# Altium footprint library IC.PcbLib: 386 footprints (part 2 of 30)
Each footprint in its own frame and in the unit in brackets; x right, y up, seen from the top. Pads: shape width x height; smd on the part's side, far side on the other; paste and mask are expansions set on the pad; w line width, h text height; cw(c..) or ccw(c..) is an arc to the next point about the centre after c.
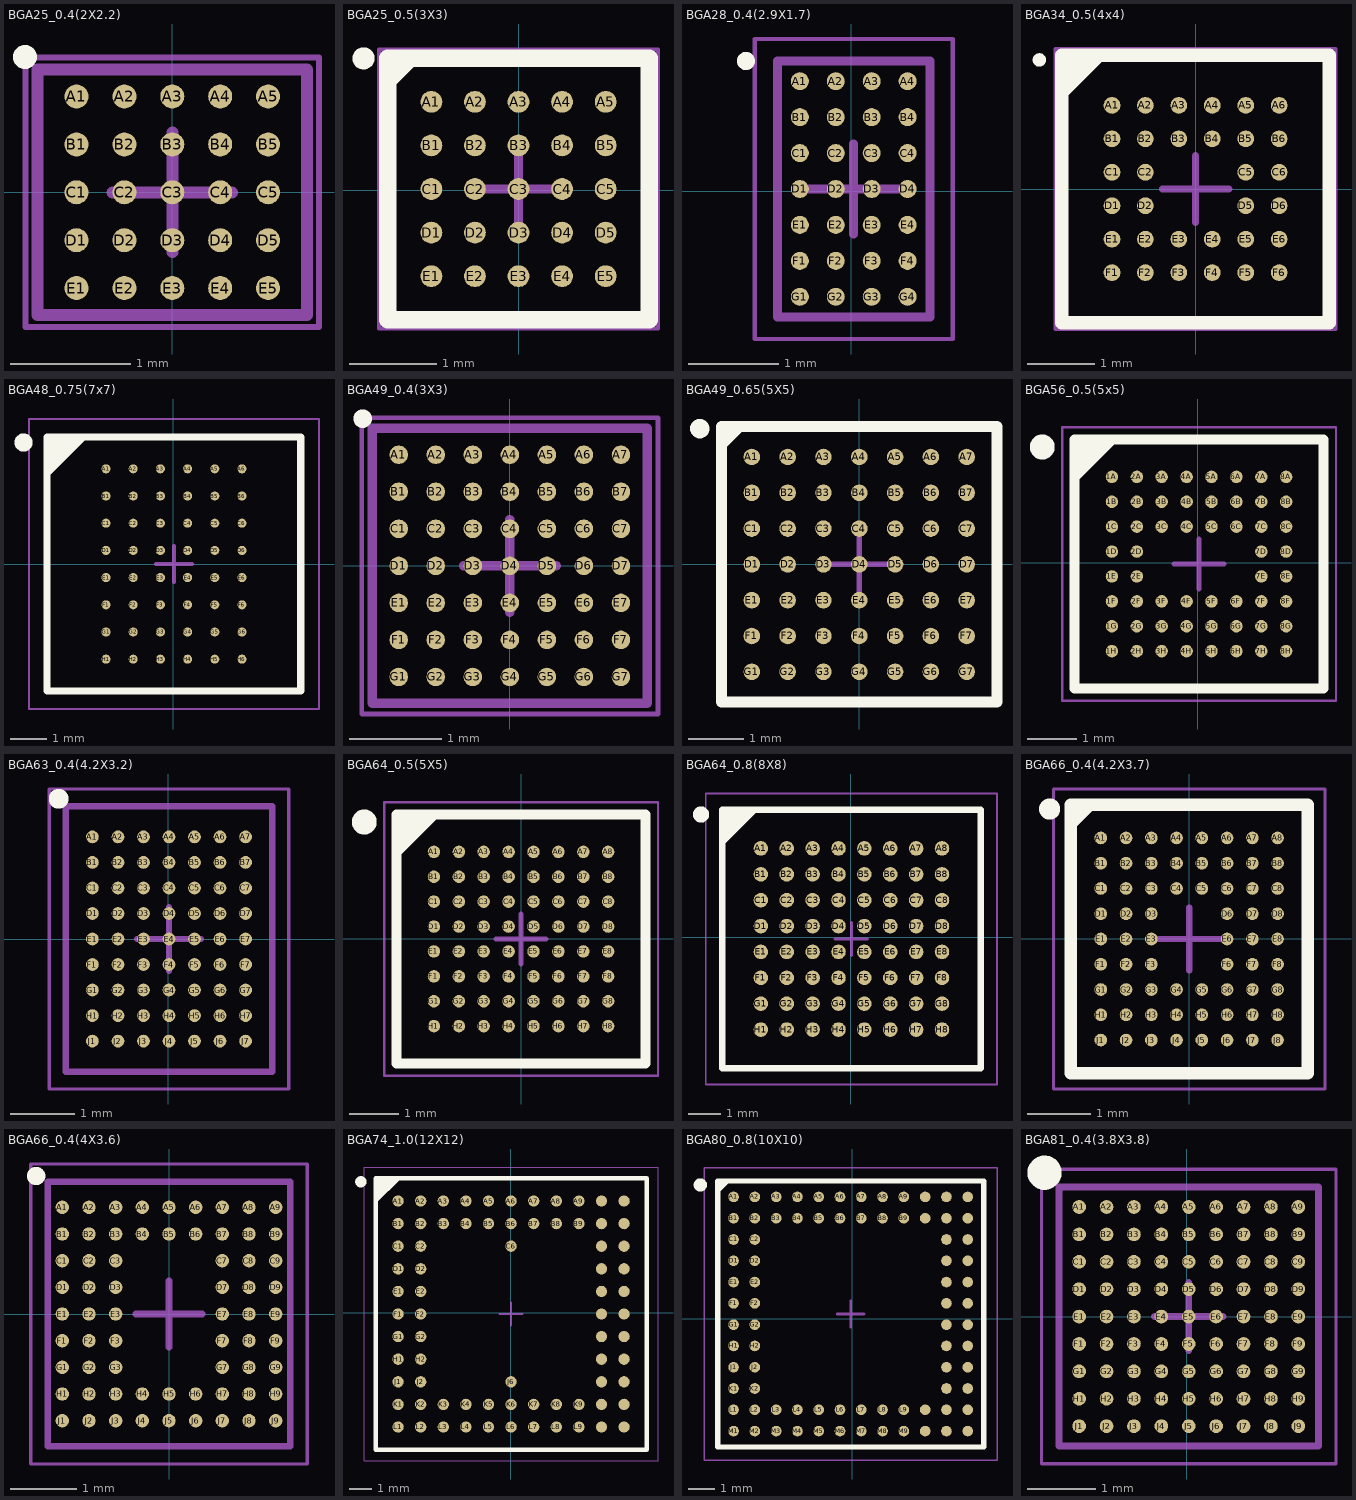
[diagram p1: the footprints below, top view; thin cyan lines are the x and y axes]

## BGA25_0.4(2X2.2) [mm]
pads (25):
  round 0.2 smd: A1(-0.8,0.8) A2(-0.4,0.8) A3(0,0.8) A4(0.4,0.8) A5(0.8,0.8) B1(-0.8,0.4) B2(-0.4,0.4) B3(0,0.4) B4(0.4,0.4) B5(0.8,0.4) C1(-0.8,0) C2(-0.4,0) C3(0,0) C4(0.4,0) C5(0.8,0) D1(-0.8,-0.4) D2(-0.4,-0.4) D3(0,-0.4) D4(0.4,-0.4) D5(0.8,-0.4) E1(-0.8,-0.8) E2(-0.4,-0.8) E3(0,-0.8) E4(0.4,-0.8) E5(0.8,-0.8)
Top Overlay:
  circle w0.1: c-1.23,1.13 r0.05
Mechanical 13:
  lines w0.1: -1.125,-1.025 1.125,-1.025 1.125,1.025 -1.125,1.025 -1.125,-1.025
Mechanical 15:
  lines w0.05: -1.225,-1.125 1.225,-1.125 1.225,1.125 -1.225,1.125 -1.225,-1.125
  lines w0.1: -0.5,0 0.5,0 ; 0,-0.5 0,0.5
3D body "BGA25C40P5X5_220X200X65.step": height 0.65, standoff 0, extent -1.1,-1 1.1,1

## BGA25_0.5(3X3) [mm]
pads (25):
  round 0.25 smd: A1(-1,1.013) A2(-0.5,1.013) A3(0,1.013) A4(0.5,1.013) A5(1,1.013) B1(-1,0.513) B2(-0.5,0.513) B3(0,0.513) B4(0.5,0.513) B5(1,0.513) C1(-1,0.013) C2(-0.5,0.013) C3(0,0.013) C4(0.5,0.013) C5(1,0.013) D1(-1,-0.487) D2(-0.5,-0.487) D3(0,-0.487) D4(0.5,-0.487) D5(1,-0.487) E1(-1,-0.987) E2(-0.5,-0.987) E3(0,-0.987) E4(0.5,-0.987) E5(1,-0.987)
Top Overlay:
  circle w0.127: c-1.778,1.511 r0.064
  region: -1.242,1.513 -1.5,1.255 -1.5,1.513
  lines w0.2: -1.5,1.255 -1.242,1.513 ; -1.5,-1.487 1.5,-1.487 1.5,1.513 -1.5,1.513 -1.5,-1.487
Mechanical 13:
  lines w0.1: -1.5,-1.487 1.5,-1.487 1.5,1.513 -1.5,1.513 -1.5,-1.487
Mechanical 15:
  lines w0.05: -1.6,-1.587 1.6,-1.587 1.6,1.613 -1.6,1.613 -1.6,-1.587
  lines w0.1: -0.5,0.013 0.5,0.013 ; 0,-0.487 0,0.513
3D body "BGA25C50P5X5_300X300X65.step": height 0.65, standoff 0, extent -1.5,-1.5 1.5,1.5

## BGA28_0.4(2.9X1.7) [mm]
pads (28):
  round 0.2 smd: A1(-0.575,1.225) A2(-0.175,1.225) A3(0.225,1.225) A4(0.625,1.225) B1(-0.575,0.825) B2(-0.175,0.825) B3(0.225,0.825) B4(0.625,0.825) C1(-0.575,0.425) C2(-0.175,0.425) C3(0.225,0.425) C4(0.625,0.425) D1(-0.575,0.025) D2(-0.175,0.025) D3(0.225,0.025) D4(0.625,0.025) E1(-0.575,-0.375) E2(-0.175,-0.375) E3(0.225,-0.375) E4(0.625,-0.375) F1(-0.575,-0.775) F2(-0.175,-0.775) F3(0.225,-0.775) F4(0.625,-0.775) G1(-0.575,-1.175) G2(-0.175,-1.175) G3(0.225,-1.175) G4(0.625,-1.175)
Top Overlay:
  circle w0.1: c-1.175,1.45 r0.05
Mechanical 13:
  lines w0.1: -0.825,-1.4 -0.825,1.45 0.875,1.45 0.875,-1.4 -0.825,-1.4
Mechanical 15:
  lines w0.05: -1.075,-1.645 -1.075,1.695 1.125,1.695 1.125,-1.645 -1.075,-1.645
  lines w0.1: -0.475,0.025 0.525,0.025 ; 0.025,-0.475 0.025,0.525
3D body "BGA28C40P4X7_170X290X65.step": height 0.65, standoff 0, extent -0.85,-1.45 0.85,1.45

## BGA34_0.5(4x4) [mm]
pads (32):
  round 0.25 smd: A1(-1.25,1.25) A2(-0.75,1.25) A3(-0.25,1.25) A4(0.25,1.25) A5(0.75,1.25) A6(1.25,1.25) B1(-1.25,0.75) B2(-0.75,0.75) B3(-0.25,0.75) B4(0.25,0.75) B5(0.75,0.75) B6(1.25,0.75) C1(-1.25,0.25) C2(-0.75,0.25) C5(0.75,0.25) C6(1.25,0.25) D1(-1.25,-0.25) D2(-0.75,-0.25) D5(0.75,-0.25) D6(1.25,-0.25) E1(-1.25,-0.75) E2(-0.75,-0.75) E3(-0.25,-0.75) E4(0.25,-0.75) E5(0.75,-0.75) E6(1.25,-0.75) F1(-1.25,-1.25) F2(-0.75,-1.25) F3(-0.25,-1.25) F4(0.25,-1.25) F5(0.75,-1.25) F6(1.25,-1.25)
Top Overlay:
  circle w0.1: c-2.337,1.93 r0.05
  region: -1.4,2 -2,1.4 -2,2
  lines w0.2: -2,1.442 -1.442,2 ; -2,-2 -2,2 2,2 2,-2 -2,-2
Mechanical 13:
  lines w0.1: -2,-2 -2,2 2,2 2,-2 -2,-2
Mechanical 15:
  lines w0.05: -2.1,-2.1 -2.1,2.1 2.1,2.1 2.1,-2.1 -2.1,-2.1
  lines w0.1: -0.5,0 0.5,0 ; 0,-0.5 0,0.5
3D body: height 0.6, standoff 0.2, extent -2,-2 2,2
3D body: height 0.61, standoff 0.18, extent -1.671,1.299 -1.273,1.698

## BGA48_0.75(7x7) [mm]
height 0.254
pads (48):
  round 0.25 smd: A1(-1.85,2.625) A2(-1.1,2.625) A3(-0.35,2.625) A4(0.4,2.625) A5(1.15,2.625) A6(1.9,2.625) B1(-1.85,1.875) B2(-1.1,1.875) B3(-0.35,1.875) B4(0.4,1.875) B5(1.15,1.875) B6(1.9,1.875) C1(-1.85,1.125) C2(-1.1,1.125) C3(-0.35,1.125) C4(0.4,1.125) C5(1.15,1.125) C6(1.9,1.125) D1(-1.85,0.375) D2(-1.1,0.375) D3(-0.35,0.375) D4(0.4,0.375) D5(1.15,0.375) D6(1.9,0.375) E1(-1.85,-0.375) E2(-1.1,-0.375) E3(-0.35,-0.375) E4(0.4,-0.375) E5(1.15,-0.375) E6(1.9,-0.375) F1(-1.85,-1.125) F2(-1.1,-1.125) F3(-0.35,-1.125) F4(0.4,-1.125) F5(1.15,-1.125) F6(1.9,-1.125) G1(-1.85,-1.875) G2(-1.1,-1.875) G3(-0.35,-1.875) G4(0.4,-1.875) G5(1.15,-1.875) G6(1.9,-1.875) H1(-1.85,-2.625) H2(-1.1,-2.625) H3(-0.35,-2.625) H4(0.4,-2.625) H5(1.15,-2.625) H6(1.9,-2.625)
Top Overlay:
  circle w0.25: c-4.125,3.35 r0.125
  region: -2.475,3.5 -3.475,2.5 -3.475,3.5
  lines w0.2: -3.475,2.5 -2.475,3.5 ; -3.475,-3.5 -3.475,3.5 3.525,3.5 3.525,-3.5 -3.475,-3.5
Mechanical 13:
  lines w0.1: -3.475,-3.5 -3.475,3.5 3.525,3.5 3.525,-3.5 -3.475,-3.5
Mechanical 15:
  lines w0.05: -3.975,-4 -3.975,4 4.025,4 4.025,-4 -3.975,-4
  lines w0.1: -0.475,0 0.525,0 ; 0.025,-0.5 0.025,0.5
3D body "BGA48C75P6X8_700X700X65.step": height 0.65, standoff 0, extent -3.474,-3.5 3.526,3.5

## BGA49_0.4(3X3) [mm]
pads (49):
  round 0.2 smd: A1(-1.2,1.2) A2(-0.8,1.2) A3(-0.4,1.2) A4(0,1.2) A5(0.4,1.2) A6(0.8,1.2) A7(1.2,1.2) B1(-1.2,0.8) B2(-0.8,0.8) B3(-0.4,0.8) B4(0,0.8) B5(0.4,0.8) B6(0.8,0.8) B7(1.2,0.8) C1(-1.2,0.4) C2(-0.8,0.4) C3(-0.4,0.4) C4(0,0.4) C5(0.4,0.4) C6(0.8,0.4) C7(1.2,0.4) D1(-1.2,0) D2(-0.8,0) D3(-0.4,0) D4(0,0) D5(0.4,0) D6(0.8,0) D7(1.2,0) E1(-1.2,-0.4) E2(-0.8,-0.4) E3(-0.4,-0.4) E4(0,-0.4) E5(0.4,-0.4) E6(0.8,-0.4) E7(1.2,-0.4) F1(-1.2,-0.8) F2(-0.8,-0.8) F3(-0.4,-0.8) F4(0,-0.8) F5(0.4,-0.8) F6(0.8,-0.8) F7(1.2,-0.8) G1(-1.2,-1.2) G2(-0.8,-1.2) G3(-0.4,-1.2) G4(0,-1.2) G5(0.4,-1.2) G6(0.8,-1.2) G7(1.2,-1.2)
Top Overlay:
  circle w0.1: c-1.59,1.59 r0.05
Mechanical 13:
  lines w0.1: -1.485,-1.485 -1.485,1.485 1.485,1.485 1.485,-1.485 -1.485,-1.485
Mechanical 15:
  lines w0.05: -1.6,-1.6 -1.6,1.6 1.6,1.6 1.6,-1.6 -1.6,-1.6
  lines w0.1: -0.5,0 0.5,0 ; 0,-0.5 0,0.5
3D body "BGA49C40P7X7_300X300X65.step": height 0.65, standoff 0, extent -1.5,-1.5 1.5,1.5

## BGA49_0.65(5X5) [mm]
pads (49):
  round 0.3 smd: A1(-1.95,1.95) A2(-1.3,1.95) A3(-0.65,1.95) A4(0,1.95) A5(0.65,1.95) A6(1.3,1.95) A7(1.95,1.95) B1(-1.95,1.3) B2(-1.3,1.3) B3(-0.65,1.3) B4(0,1.3) B5(0.65,1.3) B6(1.3,1.3) B7(1.95,1.3) C1(-1.95,0.65) C2(-1.3,0.65) C3(-0.65,0.65) C4(0,0.65) C5(0.65,0.65) C6(1.3,0.65) C7(1.95,0.65) D1(-1.95,0) D2(-1.3,0) D3(-0.65,0) D4(0,0) D5(0.65,0) D6(1.3,0) D7(1.95,0) E1(-1.95,-0.65) E2(-1.3,-0.65) E3(-0.65,-0.65) E4(0,-0.65) E5(0.65,-0.65) E6(1.3,-0.65) E7(1.95,-0.65) F1(-1.95,-1.3) F2(-1.3,-1.3) F3(-0.65,-1.3) F4(0,-1.3) F5(0.65,-1.3) F6(1.3,-1.3) F7(1.95,-1.3) G1(-1.95,-1.95) G2(-1.3,-1.95) G3(-0.65,-1.95) G4(0,-1.95) G5(0.65,-1.95) G6(1.3,-1.95) G7(1.95,-1.95)
Top Overlay:
  circle w0.25: c-2.896,2.464 r0.05
  region: -2.178,2.5 -2.5,2.178 -2.5,2.5
  lines w0.2: -2.5,2.178 -2.178,2.5 ; -2.5,-2.5 2.5,-2.5 2.5,2.5 -2.5,2.5 -2.5,-2.5
Mechanical 13:
  lines w0.1: -2.5,-2.5 2.5,-2.5 2.5,2.5 -2.5,2.5 -2.5,-2.5
Mechanical 15:
  lines w0.1: -0.5,0 0.5,0 ; 0,-0.5 0,0.5
3D body "BGA49C65P7X7_500X500X100.step": height 1, standoff 0, extent -2.5,-2.475 2.5,2.525

## BGA56_0.5(5x5) [mm]
height 0.254
pads (56):
  round 0.25 smd: 1A(-1.725,1.725) 1B(-1.725,1.225) 1C(-1.725,0.725) 1D(-1.725,0.225) 1E(-1.725,-0.275) 1F(-1.725,-0.775) 1G(-1.725,-1.275) 1H(-1.725,-1.775) 2A(-1.225,1.725) 2B(-1.225,1.225) 2C(-1.225,0.725) 2D(-1.225,0.225) 2E(-1.225,-0.275) 2F(-1.225,-0.775) 2G(-1.225,-1.275) 2H(-1.225,-1.775) 3A(-0.725,1.725) 3B(-0.725,1.225) 3C(-0.725,0.725) 3F(-0.725,-0.775) 3G(-0.725,-1.275) 3H(-0.725,-1.775) 4A(-0.225,1.725) 4B(-0.225,1.225) 4C(-0.225,0.725) 4F(-0.225,-0.775) 4G(-0.225,-1.275) 4H(-0.225,-1.775) 5A(0.275,1.725) 5B(0.275,1.225) 5C(0.275,0.725) 5F(0.275,-0.775) 5G(0.275,-1.275) 5H(0.275,-1.775) 6A(0.775,1.725) 6B(0.775,1.225) 6C(0.775,0.725) 6F(0.775,-0.775) 6G(0.775,-1.275) 6H(0.775,-1.775) 7A(1.275,1.725) 7B(1.275,1.225) 7C(1.275,0.725) 7D(1.275,0.225) 7E(1.275,-0.275) 7F(1.275,-0.775) 7G(1.275,-1.275) 7H(1.275,-1.775) 8A(1.775,1.725) 8B(1.775,1.225) 8C(1.775,0.725) 8D(1.775,0.225) 8E(1.775,-0.275) 8F(1.775,-0.775) 8G(1.775,-1.275) 8H(1.775,-1.775)
Top Overlay:
  circle w0.25: c-3.125,2.325 r0.125
  region: -1.717,2.475 -2.475,1.717 -2.475,2.475
  lines w0.2: -2.475,1.717 -1.717,2.475 ; -2.475,-2.525 -2.475,2.475 2.525,2.475 2.525,-2.525 -2.475,-2.525
Mechanical 13:
  lines w0.1: -2.475,-2.525 -2.475,2.475 2.525,2.475 2.525,-2.525 -2.475,-2.525
Mechanical 15:
  lines w0.05: -2.725,-2.775 -2.725,2.725 2.775,2.725 2.775,-2.775 -2.725,-2.775
  lines w0.1: -0.475,-0.025 0.525,-0.025 ; 0.025,-0.525 0.025,0.475
3D body: height 1.03, standoff 0.18, extent -2.23,1.832 -1.832,2.232
3D body: height 1, standoff 0.16, extent -2.475,-2.525 2.525,2.475

## BGA63_0.4(4.2X3.2) [mm]
pads (63):
  round 0.2 smd: A1(-1.187,1.6) A2(-0.787,1.6) A3(-0.387,1.6) A4(0.013,1.6) A5(0.413,1.6) A6(0.813,1.6) A7(1.213,1.6) B1(-1.187,1.2) B2(-0.787,1.2) B3(-0.387,1.2) B4(0.013,1.2) B5(0.413,1.2) B6(0.813,1.2) B7(1.213,1.2) C1(-1.187,0.8) C2(-0.787,0.8) C3(-0.387,0.8) C4(0.013,0.8) C5(0.413,0.8) C6(0.813,0.8) C7(1.213,0.8) D1(-1.187,0.4) D2(-0.787,0.4) D3(-0.387,0.4) D4(0.013,0.4) D5(0.413,0.4) D6(0.813,0.4) D7(1.213,0.4) E1(-1.187,0) E2(-0.787,0) E3(-0.387,0) E4(0.013,0) E5(0.413,0) E6(0.813,0) E7(1.213,0) F1(-1.187,-0.4) F2(-0.787,-0.4) F3(-0.387,-0.4) F4(0.013,-0.4) F5(0.413,-0.4) F6(0.813,-0.4) F7(1.213,-0.4) G1(-1.187,-0.8) G2(-0.787,-0.8) G3(-0.387,-0.8) G4(0.013,-0.8) G5(0.413,-0.8) G6(0.813,-0.8) G7(1.213,-0.8) H1(-1.187,-1.2) H2(-0.787,-1.2) H3(-0.387,-1.2) H4(0.013,-1.2) H5(0.413,-1.2) H6(0.813,-1.2) H7(1.213,-1.2) J1(-1.187,-1.6) J2(-0.787,-1.6) J3(-0.387,-1.6) J4(0.013,-1.6) J5(0.413,-1.6) J6(0.813,-1.6) J7(1.213,-1.6)
Top Overlay:
  circle w0.25: c-1.714,2.197 r0.029
Mechanical 13:
  lines w0.1: -1.602,-2.08 1.628,-2.08 1.628,2.08 -1.602,2.08 -1.602,-2.08
Mechanical 15:
  lines w0.05: -1.862,-2.35 1.888,-2.35 1.888,2.35 -1.862,2.35 -1.862,-2.35
  lines w0.1: -0.487,0 0.513,0 ; 0.013,-0.5 0.013,0.5
3D body "BGA63C40P7X9_320X420X65.step": height 0.65, standoff 0, extent -1.6,-2.1 1.6,2.1

## BGA64_0.5(5X5) [mm]
pads (64):
  round 0.25 smd: A1(-1.75,1.75) A2(-1.25,1.75) A3(-0.75,1.75) A4(-0.25,1.75) A5(0.25,1.75) A6(0.75,1.75) A7(1.25,1.75) A8(1.75,1.75) B1(-1.75,1.25) B2(-1.25,1.25) B3(-0.75,1.25) B4(-0.25,1.25) B5(0.25,1.25) B6(0.75,1.25) B7(1.25,1.25) B8(1.75,1.25) C1(-1.75,0.75) C2(-1.25,0.75) C3(-0.75,0.75) C4(-0.25,0.75) C5(0.25,0.75) C6(0.75,0.75) C7(1.25,0.75) C8(1.75,0.75) D1(-1.75,0.25) D2(-1.25,0.25) D3(-0.75,0.25) D4(-0.25,0.25) D5(0.25,0.25) D6(0.75,0.25) D7(1.25,0.25) D8(1.75,0.25) E1(-1.75,-0.25) E2(-1.25,-0.25) E3(-0.75,-0.25) E4(-0.25,-0.25) E5(0.25,-0.25) E6(0.75,-0.25) E7(1.25,-0.25) E8(1.75,-0.25) F1(-1.75,-0.75) F2(-1.25,-0.75) F3(-0.75,-0.75) F4(-0.25,-0.75) F5(0.25,-0.75) F6(0.75,-0.75) F7(1.25,-0.75) F8(1.75,-0.75) G1(-1.75,-1.25) G2(-1.25,-1.25) G3(-0.75,-1.25) G4(-0.25,-1.25) G5(0.25,-1.25) G6(0.75,-1.25) G7(1.25,-1.25) G8(1.75,-1.25) H1(-1.75,-1.75) H2(-1.25,-1.75) H3(-0.75,-1.75) H4(-0.25,-1.75) H5(0.25,-1.75) H6(0.75,-1.75) H7(1.25,-1.75) H8(1.75,-1.75)
Top Overlay:
  circle w0.25: c-3.15,2.35 r0.125
  region: -1.742,2.5 -2.5,1.742 -2.5,2.5
  lines w0.2: -2.5,1.742 -1.742,2.5 ; -2.5,-2.5 2.5,-2.5 2.5,2.5 -2.5,2.5 -2.5,-2.5
Mechanical 13:
  lines w0.1: -2.5,-2.5 2.5,-2.5 2.5,2.5 -2.5,2.5 -2.5,-2.5
Mechanical 15:
  lines w0.05: -2.75,-2.75 2.75,-2.75 2.75,2.75 -2.75,2.75 -2.75,-2.75
  lines w0.1: -0.5,0 0.5,0 ; 0,-0.5 0,0.5
3D body "User Library-BGA64C50P8X8_500X500X120.STEP": height 1.2, standoff 0.01, extent -2.5,-2.487 2.5,2.513

## BGA64_0.8(8X8) [mm]
pads (64):
  round 0.45 smd: A1(-2.775,2.749) A2(-1.975,2.749) A3(-1.175,2.749) A4(-0.375,2.749) A5(0.425,2.749) A6(1.225,2.749) A7(2.025,2.749) A8(2.825,2.749) B1(-2.775,1.949) B2(-1.975,1.949) B3(-1.175,1.949) B4(-0.375,1.949) B5(0.425,1.949) B6(1.225,1.949) B7(2.025,1.949) B8(2.825,1.949) C1(-2.775,1.149) C2(-1.975,1.149) C3(-1.175,1.149) C4(-0.375,1.149) C5(0.425,1.149) C6(1.225,1.149) C7(2.025,1.149) C8(2.825,1.149) D1(-2.775,0.349) D2(-1.975,0.349) D3(-1.175,0.349) D4(-0.375,0.349) D5(0.425,0.349) D6(1.225,0.349) D7(2.025,0.349) D8(2.825,0.349) E1(-2.775,-0.451) E2(-1.975,-0.451) E3(-1.175,-0.451) E4(-0.375,-0.451) E5(0.425,-0.451) E6(1.225,-0.451) E7(2.025,-0.451) E8(2.825,-0.451) F1(-2.775,-1.251) F2(-1.975,-1.251) F3(-1.175,-1.251) F4(-0.375,-1.251) F5(0.425,-1.251) F6(1.225,-1.251) F7(2.025,-1.251) F8(2.825,-1.251) G1(-2.775,-2.051) G2(-1.975,-2.051) G3(-1.175,-2.051) G4(-0.375,-2.051) G5(0.425,-2.051) G6(1.225,-2.051) G7(2.025,-2.051) G8(2.825,-2.051) H1(-2.775,-2.851) H2(-1.975,-2.851) H3(-1.175,-2.851) H4(-0.375,-2.851) H5(0.425,-2.851) H6(1.225,-2.851) H7(2.025,-2.851) H8(2.825,-2.851)
Top Overlay:
  circle w0.25: c-4.625,3.799 r0.125
  region: -2.975,3.949 -3.975,2.949 -3.975,3.949
  lines w0.2: -3.975,2.949 -2.975,3.949 ; -3.975,-4.051 -3.975,3.949 4.025,3.949 4.025,-4.051 -3.975,-4.051
Mechanical 13:
  lines w0.1: -3.975,-4.051 -3.975,3.949 4.025,3.949 4.025,-4.051 -3.975,-4.051
Mechanical 15:
  lines w0.05: -4.475,-4.551 -4.475,4.449 4.525,4.449 4.525,-4.551 -4.475,-4.551
  lines w0.1: -0.475,-0.051 0.525,-0.051 ; 0.025,-0.551 0.025,0.449
3D body "User Library-bga64.STEP": height 1.55, standoff 0.07, extent -3.975,-4.051 4.025,3.949

## BGA66_0.4(4.2X3.7) [mm]
pads (66):
  round 0.2 smd: A1(-1.4,1.6) A2(-1,1.6) A3(-0.6,1.6) A4(-0.2,1.6) A5(0.2,1.6) A6(0.6,1.6) A7(1,1.6) A8(1.4,1.6) B1(-1.4,1.2) B2(-1,1.2) B3(-0.6,1.2) B4(-0.2,1.2) B5(0.2,1.2) B6(0.6,1.2) B7(1,1.2) B8(1.4,1.2) C1(-1.4,0.8) C2(-1,0.8) C3(-0.6,0.8) C4(-0.2,0.8) C5(0.2,0.8) C6(0.6,0.8) C7(1,0.8) C8(1.4,0.8) D1(-1.4,0.4) D2(-1,0.4) D3(-0.6,0.4) D6(0.6,0.4) D7(1,0.4) D8(1.4,0.4) E1(-1.4,0) E2(-1,0) E3(-0.6,0) E6(0.6,0) E7(1,0) E8(1.4,0) F1(-1.4,-0.4) F2(-1,-0.4) F3(-0.6,-0.4) F6(0.6,-0.4) F7(1,-0.4) F8(1.4,-0.4) G1(-1.4,-0.8) G2(-1,-0.8) G3(-0.6,-0.8) G4(-0.2,-0.8) G5(0.2,-0.8) G6(0.6,-0.8) G7(1,-0.8) G8(1.4,-0.8) H1(-1.4,-1.2) H2(-1,-1.2) H3(-0.6,-1.2) H4(-0.2,-1.2) H5(0.2,-1.2) H6(0.6,-1.2) H7(1,-1.2) H8(1.4,-1.2) J1(-1.4,-1.6) J2(-1,-1.6) J3(-0.6,-1.6) J4(-0.2,-1.6) J5(0.2,-1.6) J6(0.6,-1.6) J7(1,-1.6) J8(1.4,-1.6)
Top Overlay:
  circle w0.25: c-2.21,2.057 r0.042
  region: -1.582,2.125 -1.875,1.832 -1.875,2.125
  lines w0.2: -1.875,1.832 -1.582,2.125 ; -1.875,-2.125 1.875,-2.125 1.875,2.125 -1.875,2.125 -1.875,-2.125
Mechanical 13:
  lines w0.1: -1.885,-2.115 1.885,-2.115 1.885,2.115 -1.885,2.115 -1.885,-2.115
Mechanical 15:
  lines w0.05: -2.15,-2.375 2.15,-2.375 2.15,2.375 -2.15,2.375 -2.15,-2.375
  lines w0.1: -0.5,0 0.5,0 ; 0,-0.5 0,0.5
3D body: height 0.61, standoff 0.18, extent -1.627,1.415 -1.229,1.814
3D body: height 0.6, standoff 0.17, extent -1.885,-2.115 1.885,2.115

## BGA66_0.4(4X3.6) [mm]
pads (66):
  round 0.2 smd: A1(-1.6,1.6) A2(-1.2,1.6) A3(-0.8,1.6) A4(-0.4,1.6) A5(0,1.6) A6(0.4,1.6) A7(0.8,1.6) A8(1.2,1.6) A9(1.6,1.6) B1(-1.6,1.2) B2(-1.2,1.2) B3(-0.8,1.2) B4(-0.4,1.2) B5(0,1.2) B6(0.4,1.2) B7(0.8,1.2) B8(1.2,1.2) B9(1.6,1.2) C1(-1.6,0.8) C2(-1.2,0.8) C3(-0.8,0.8) C7(0.8,0.8) C8(1.2,0.8) C9(1.6,0.8) D1(-1.6,0.4) D2(-1.2,0.4) D3(-0.8,0.4) D7(0.8,0.4) D8(1.2,0.4) D9(1.6,0.4) E1(-1.6,0) E2(-1.2,0) E3(-0.8,0) E7(0.8,0) E8(1.2,0) E9(1.6,0) F1(-1.6,-0.4) F2(-1.2,-0.4) F3(-0.8,-0.4) F7(0.8,-0.4) F8(1.2,-0.4) F9(1.6,-0.4) G1(-1.6,-0.8) G2(-1.2,-0.8) G3(-0.8,-0.8) G7(0.8,-0.8) G8(1.2,-0.8) G9(1.6,-0.8) H1(-1.6,-1.2) H2(-1.2,-1.2) H3(-0.8,-1.2) H4(-0.4,-1.2) H5(0,-1.2) H6(0.4,-1.2) H7(0.8,-1.2) H8(1.2,-1.2) H9(1.6,-1.2) J1(-1.6,-1.6) J2(-1.2,-1.6) J3(-0.8,-1.6) J4(-0.4,-1.6) J5(0,-1.6) J6(0.4,-1.6) J7(0.8,-1.6) J8(1.2,-1.6) J9(1.6,-1.6)
Top Overlay:
  circle w0.25: c-1.994,2.07 r0.013
Mechanical 13:
  lines w0.1: -1.82,-1.985 -1.82,1.985 1.82,1.985 1.82,-1.985 -1.82,-1.985
Mechanical 15:
  lines w0.05: -2.075,-2.25 -2.075,2.25 2.075,2.25 2.075,-2.25 -2.075,-2.25
  lines w0.1: -0.5,0 0.5,0 ; 0,-0.5 0,0.5
3D body: height 0.61, standoff 0.18, extent -1.652,1.466 -1.254,1.865
3D body: height 0.6, standoff 0.17, extent -1.82,-1.985 1.82,1.985

## BGA74_1.0(12X12) [mm]
pads (74):
  round 0.5 smd: A1(-4.975,4.949) A2(-3.975,4.949) A3(-2.975,4.949) A4(-1.975,4.949) A5(-0.975,4.949) A6(0.025,4.949) A7(1.025,4.949) A8(2.025,4.949) A9(3.025,4.949) A10(4.025,4.949) A11(5.025,4.949) B1(-4.975,3.949) B2(-3.975,3.949) B3(-2.975,3.949) B4(-1.975,3.949) B5(-0.975,3.949) B6(0.025,3.949) B7(1.025,3.949) B8(2.025,3.949) B9(3.025,3.949) B10(4.025,3.949) B11(5.025,3.949) C1(-4.975,2.949) C2(-3.975,2.949) C6(0.025,2.949) C10(4.025,2.949) C11(5.025,2.949) D1(-4.975,1.949) D2(-3.975,1.949) D10(4.025,1.949) D11(5.025,1.949) E1(-4.975,0.949) E2(-3.975,0.949) E10(4.025,0.949) E11(5.025,0.949) F1(-4.975,-0.051) F2(-3.975,-0.051) F10(4.025,-0.051) F11(5.025,-0.051) G1(-4.975,-1.051) G2(-3.975,-1.051) G10(4.025,-1.051) G11(5.025,-1.051) H1(-4.975,-2.051) H2(-3.975,-2.051) H10(4.025,-2.051) H11(5.025,-2.051) J1(-4.975,-3.051) J2(-3.975,-3.051) J6(0.025,-3.051) J10(4.025,-3.051) J11(5.025,-3.051) K1(-4.975,-4.051) K2(-3.975,-4.051) K3(-2.975,-4.051) K4(-1.975,-4.051) K5(-0.975,-4.051) K6(0.025,-4.051) K7(1.025,-4.051) K8(2.025,-4.051) K9(3.025,-4.051) K10(4.025,-4.051) K11(5.025,-4.051) L1(-4.975,-5.051) L2(-3.975,-5.051) L3(-2.975,-5.051) L4(-1.975,-5.051) L5(-0.975,-5.051) L6(0.025,-5.051) L7(1.025,-5.051) L8(2.025,-5.051) L9(3.025,-5.051) L10(4.025,-5.051) L11(5.025,-5.051)
Top Overlay:
  circle w0.25: c-6.625,5.799 r0.125
  region: -4.975,5.949 -5.975,4.949 -5.975,5.949
  lines w0.2: -5.975,4.949 -4.975,5.949 ; -5.975,-6.051 -5.975,5.949 6.025,5.949 6.025,-6.051 -5.975,-6.051
Mechanical 13:
  lines w0.1: -5.975,-6.051 -5.975,5.949 6.025,5.949 6.025,-6.051 -5.975,-6.051
Mechanical 15:
  lines w0.05: -6.475,-6.551 -6.475,6.449 6.525,6.449 6.525,-6.551 -6.475,-6.551
  lines w0.1: -0.475,-0.051 0.525,-0.051 ; 0.025,-0.551 0.025,0.449
3D body: height 1.7, standoff 0.3, extent -5.975,-6.051 6.025,5.949

## BGA80_0.8(10X10) [mm]
pads (80):
  round 0.4 smd: A1(-4.451,4.578) A2(-3.651,4.578) A3(-2.851,4.578) A4(-2.051,4.578) A5(-1.251,4.578) A6(-0.451,4.578) A7(0.349,4.578) A8(1.149,4.578) A9(1.949,4.578) A10(2.749,4.578) A11(3.549,4.578) A12(4.349,4.578) B1(-4.451,3.778) B2(-3.651,3.778) B3(-2.851,3.778) B4(-2.051,3.778) B5(-1.251,3.778) B6(-0.451,3.778) B7(0.349,3.778) B8(1.149,3.778) B9(1.949,3.778) B10(2.749,3.778) B11(3.549,3.778) B12(4.349,3.778) C1(-4.451,2.978) C2(-3.651,2.978) C11(3.549,2.978) C12(4.349,2.978) D1(-4.451,2.178) D2(-3.651,2.178) D11(3.549,2.178) D12(4.349,2.178) E1(-4.451,1.378) E2(-3.651,1.378) E11(3.549,1.378) E12(4.349,1.378) F1(-4.451,0.578) F2(-3.651,0.578) F11(3.549,0.578) F12(4.349,0.578) G1(-4.451,-0.222) G2(-3.651,-0.222) G11(3.549,-0.222) G12(4.349,-0.222) H1(-4.451,-1.022) H2(-3.651,-1.022) H11(3.549,-1.022) H12(4.349,-1.022) J1(-4.451,-1.822) J2(-3.651,-1.822) J11(3.549,-1.822) J12(4.349,-1.822) K1(-4.451,-2.622) K2(-3.651,-2.622) K11(3.549,-2.622) K12(4.349,-2.622) L1(-4.451,-3.422) L2(-3.651,-3.422) L3(-2.851,-3.422) L4(-2.051,-3.422) L5(-1.251,-3.422) L6(-0.451,-3.422) L7(0.349,-3.422) L8(1.149,-3.422) L9(1.949,-3.422) L10(2.749,-3.422) L11(3.549,-3.422) L12(4.349,-3.422) M1(-4.451,-4.222) M2(-3.651,-4.222) M3(-2.851,-4.222) M4(-2.051,-4.222) M5(-1.251,-4.222) M6(-0.451,-4.222) M7(0.349,-4.222) M8(1.149,-4.222) M9(1.949,-4.222) M10(2.749,-4.222) M11(3.549,-4.222) M12(4.349,-4.222)
Top Overlay:
  circle w0.25: c-5.701,5.028 r0.125
  region: -4.699,5.178 -5.051,4.826 -5.051,5.178
  lines w0.2: -5.051,4.826 -4.699,5.178 ; -5.051,-4.822 4.949,-4.822 4.949,5.178 -5.051,5.178 -5.051,-4.822
Mechanical 13:
  lines w0.1: -5.051,-4.822 4.949,-4.822 4.949,5.178 -5.051,5.178 -5.051,-4.822
Mechanical 15:
  lines w0.05: -5.551,-5.322 5.449,-5.322 5.449,5.678 -5.551,5.678 -5.551,-5.322
  lines w0.1: -0.551,0.178 0.449,0.178 ; -0.051,-0.322 -0.051,0.678
3D body: height 1.5, standoff 0.3, extent -5.051,-4.822 4.949,5.178

## BGA81_0.4(3.8X3.8) [mm]
height 0.254
pads (81):
  round 0.2 smd: A1(-1.575,1.6) A2(-1.175,1.6) A3(-0.775,1.6) A4(-0.375,1.6) A5(0.025,1.6) A6(0.425,1.6) A7(0.825,1.6) A8(1.225,1.6) A9(1.625,1.6) B1(-1.575,1.2) B2(-1.175,1.2) B3(-0.775,1.2) B4(-0.375,1.2) B5(0.025,1.2) B6(0.425,1.2) B7(0.825,1.2) B8(1.225,1.2) B9(1.625,1.2) C1(-1.575,0.8) C2(-1.175,0.8) C3(-0.775,0.8) C4(-0.375,0.8) C5(0.025,0.8) C6(0.425,0.8) C7(0.825,0.8) C8(1.225,0.8) C9(1.625,0.8) D1(-1.575,0.4) D2(-1.175,0.4) D3(-0.775,0.4) D4(-0.375,0.4) D5(0.025,0.4) D6(0.425,0.4) D7(0.825,0.4) D8(1.225,0.4) D9(1.625,0.4) E1(-1.575,0) E2(-1.175,0) E3(-0.775,0) E4(-0.375,0) E5(0.025,0) E6(0.425,0) E7(0.825,0) E8(1.225,0) E9(1.625,0) F1(-1.575,-0.4) F2(-1.175,-0.4) F3(-0.775,-0.4) F4(-0.375,-0.4) F5(0.025,-0.4) F6(0.425,-0.4) F7(0.825,-0.4) F8(1.225,-0.4) F9(1.625,-0.4) G1(-1.575,-0.8) G2(-1.175,-0.8) G3(-0.775,-0.8) G4(-0.375,-0.8) G5(0.025,-0.8) G6(0.425,-0.8) G7(0.825,-0.8) G8(1.225,-0.8) G9(1.625,-0.8) H1(-1.575,-1.2) H2(-1.175,-1.2) H3(-0.775,-1.2) H4(-0.375,-1.2) H5(0.025,-1.2) H6(0.425,-1.2) H7(0.825,-1.2) H8(1.225,-1.2) H9(1.625,-1.2) J1(-1.575,-1.6) J2(-1.175,-1.6) J3(-0.775,-1.6) J4(-0.375,-1.6) J5(0.025,-1.6) J6(0.425,-1.6) J7(0.825,-1.6) J8(1.225,-1.6) J9(1.625,-1.6)
Top Overlay:
  circle w0.25: c-2.08,2.1 r0.125
Mechanical 13:
  lines w0.1: -1.87,-1.89 1.92,-1.89 1.92,1.89 -1.87,1.89 -1.87,-1.89
Mechanical 15:
  lines w0.05: -2.125,-2.15 2.175,-2.15 2.175,2.15 -2.125,2.15 -2.125,-2.15
  lines w0.1: -0.475,0 0.525,0 ; 0.025,-0.5 0.025,0.5
3D body "BGA81C40P9X9_380X380X65.step": height 0.65, standoff 0, extent -1.9,-1.9 1.9,1.9